# Altium footprint library sun_library.PcbLib: 412 footprints (part 20 of 26)
Each footprint in its own frame and in the unit in brackets; x right, y up, seen from the top. Pads: shape width x height; smd on the part's side, far side on the other; paste and mask are expansions set on the pad; w line width, h text height; cw(c..) or ccw(c..) is an arc to the next point about the centre after c.
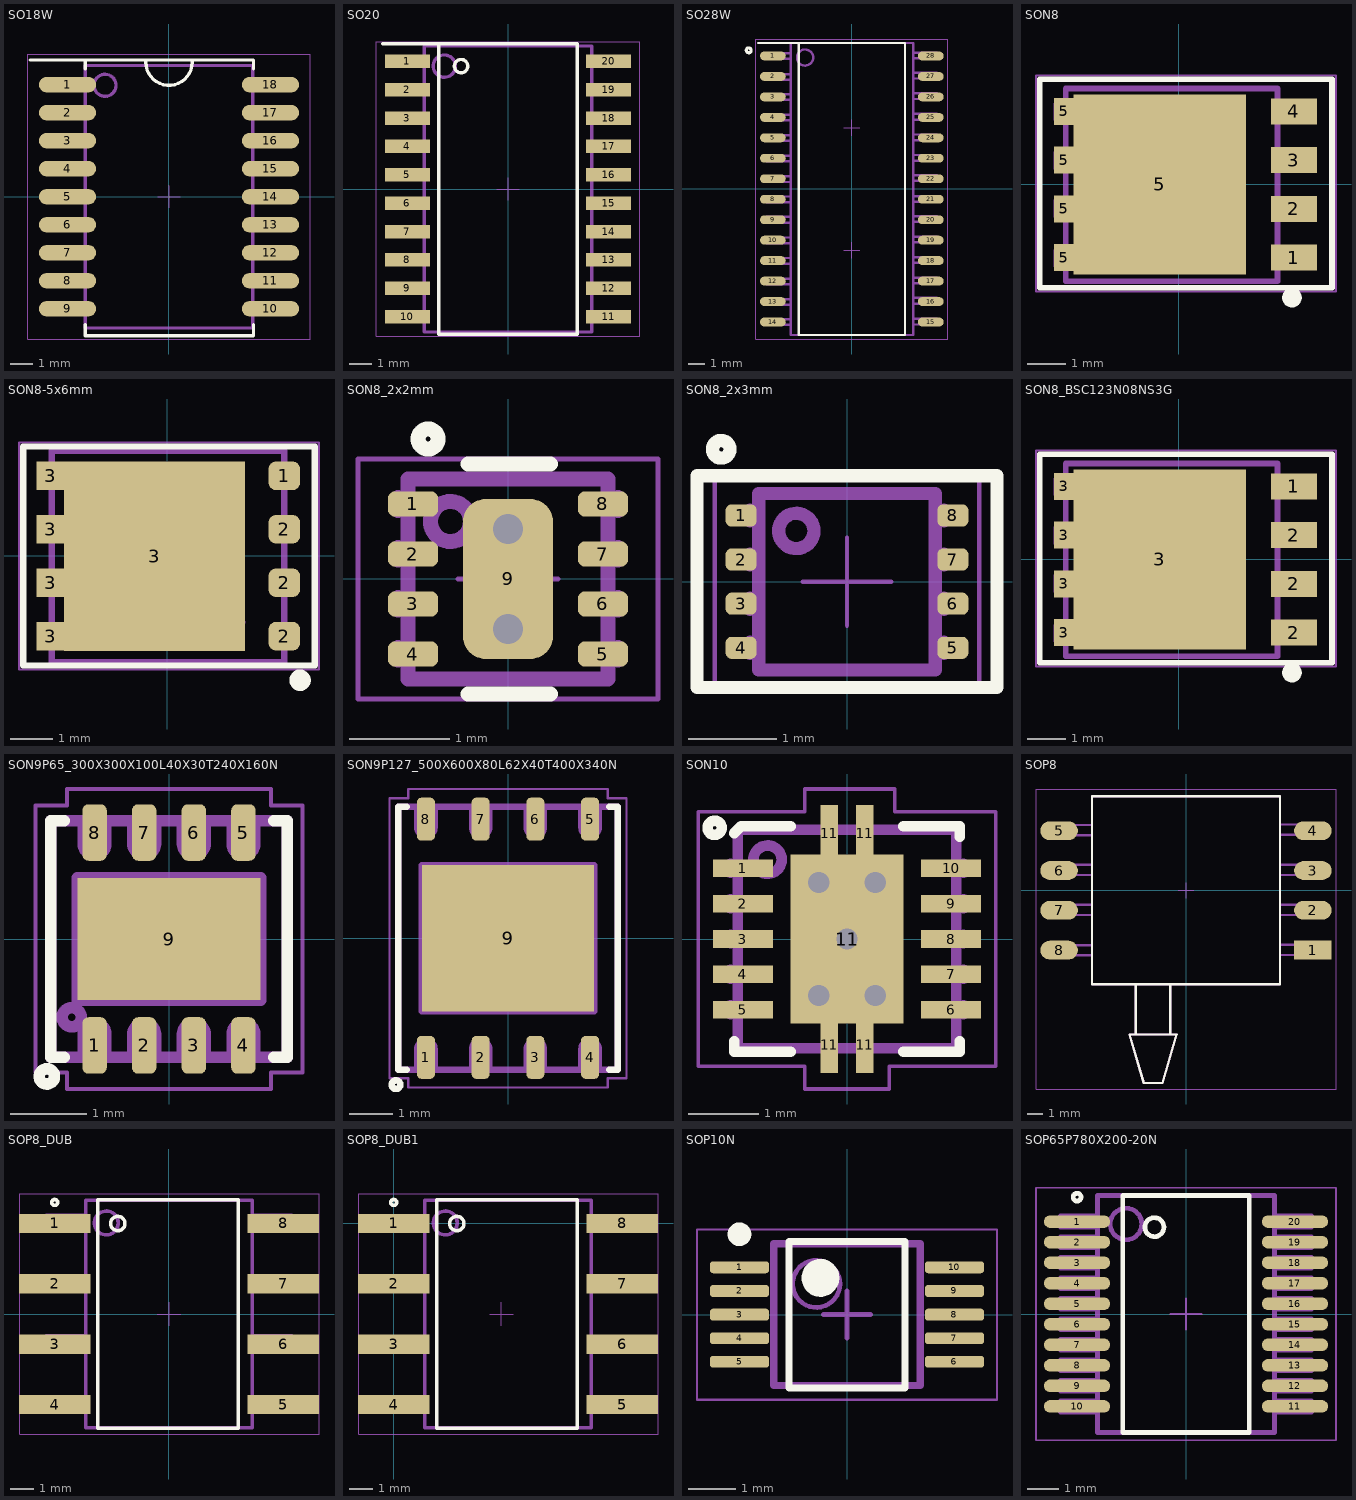
[diagram p19: the footprints below, top view; thin cyan lines are the x and y axes]

## SO18W [mm] "18-Pin Small Outline Integrated Circuit 1.27 mm Pitch, IPC Low Density"
height 2.65
pads (18):
  oval 2.6x0.7 smd: 1(-4.6,5.08) 2(-4.6,3.81) 3(-4.6,2.54) 4(-4.6,1.27) 5(-4.6,0) 6(-4.6,-1.27) 7(-4.6,-2.54) 8(-4.6,-3.81) 9(-4.6,-5.08) 10(4.6,-5.08) 11(4.6,-3.81) 12(4.6,-2.54) 13(4.6,-1.27) 14(4.6,0) 15(4.6,1.27) 16(4.6,2.54) 17(4.6,3.81) 18(4.6,5.08)
Top Overlay:
  lines w0.15: -6.3,6.2 -3.8,6.2 ; -3.8,-5.8 -3.8,-6.3 3.83,-6.3 3.83,-5.8 ; -3.8,5.8 -3.8,6.2 ; -1.05,6.1 ccw(c0,6.1) 1.05,6.1 ; 3.83,5.8 3.83,6.2 -3.8,6.2
TopAssy 13:
  circle w0.15: c-2.9,5.05 r0.5
  lines w0.15: -3.8,-5.25 -5.275,-5.25 -5.275,-4.9 -3.8,-4.9 ; -3.8,-3.975 -5.275,-3.975 -5.275,-3.625 -3.8,-3.625 ; -3.8,-2.725 -5.275,-2.725 -5.275,-2.375 -3.8,-2.375 ; -3.8,-1.45 -5.275,-1.45 -5.275,-1.1 -3.8,-1.1 ; -3.8,-0.175 -5.275,-0.175 -5.275,0.175 -3.8,0.175 ; -3.8,1.1 -5.275,1.1 -5.275,1.45 -3.8,1.45 ; -3.8,2.375 -5.275,2.375 -5.275,2.725 -3.8,2.725 ; -3.8,3.625 -5.275,3.625 -5.275,3.975 -3.8,3.975 ; -3.8,4.925 -5.275,4.925 -5.275,5.275 -3.8,5.275 ; 3.8,-5.25 5.275,-5.25 5.275,-4.9 3.8,-4.9 ; 3.8,-3.95 5.275,-3.95 5.275,-3.6 3.8,-3.6 ; 3.8,-2.7 5.275,-2.7 5.275,-2.35 3.8,-2.35 ; 3.8,-1.425 5.275,-1.425 5.275,-1.075 3.8,-1.075 ; 3.8,-0.15 5.275,-0.15 5.275,0.2 3.8,0.2 ; 3.8,1.125 5.275,1.125 5.275,1.475 3.8,1.475 ; 3.8,2.4 5.275,2.4 5.275,2.75 3.8,2.75 ; 3.8,3.65 5.275,3.65 5.275,4 3.8,4 ; 3.8,4.925 5.275,4.925 5.275,5.275 3.8,5.275 ; -3.8,-5.95 -3.8,5.95 3.8,5.95 3.8,-5.95 -3.8,-5.95
CourtTop 15:
  lines w0.05: -0.5,0 0.5,0 ; 0,-0.5 0,0.5 ; -6.4,-6.45 6.4,-6.45 6.4,6.45 -6.4,6.45 -6.4,-6.45
3D body "User Library-SOIC-18-300.STEP": height 2.57, standoff -0.03, extent -5.275,-5.875 5.325,5.875

## SO20 [mm]
height 1.1
pads (20):
  rect 2x0.6 smd: 1(-4.5,5.715) 2(-4.5,4.445) 3(-4.5,3.175) 4(-4.5,1.905) 5(-4.5,0.635) 6(-4.5,-0.635) 7(-4.5,-1.905) 8(-4.5,-3.175) 9(-4.5,-4.445) 10(-4.5,-5.715) 11(4.5,-5.715) 12(4.5,-4.445) 13(4.5,-3.175) 14(4.5,-1.905) 15(4.5,-0.635) 16(4.5,0.635) 17(4.5,1.905) 18(4.5,3.175) 19(4.5,4.445) 20(4.5,5.715)
Top Overlay:
  circle w0.15: c-2.1,5.5 r0.3
  lines w0.15: -5.6,6.5 -3.1,6.5 ; -3.1,6.5 3.1,6.5 3.1,-6.5 -3.1,-6.5 -3.1,6.5
TopAssy 13:
  circle w0.15: c-2.85,5.5 r0.5
  lines w0.15: -3.775,-3.375 -5.275,-3.375 -5.275,-3.025 -3.775,-3.025 ; -3.775,-2.1 -5.275,-2.1 -5.275,-1.75 -3.775,-1.75 ; -3.775,-0.825 -5.275,-0.825 -5.275,-0.475 -3.775,-0.475 ; -3.775,0.45 -5.3,0.45 -5.3,0.8 -3.775,0.8 ; -3.775,1.725 -5.3,1.725 -5.3,2.075 -3.775,2.075 ; -3.775,3 -5.3,3 -5.3,3.35 -3.775,3.35 ; -3.775,4.25 -5.3,4.25 -5.3,4.6 -3.775,4.6 ; -3.775,5.55 -5.3,5.55 -5.3,5.9 -3.775,5.9 ; -3.75,-5.9 -5.25,-5.9 -5.25,-5.55 -3.75,-5.55 ; -3.75,-4.625 -5.25,-4.625 -5.25,-4.275 -3.75,-4.275 ; 3.725,4.275 5.225,4.275 5.225,4.625 3.725,4.625 ; 3.725,5.55 5.225,5.55 5.225,5.9 3.725,5.9 ; 3.75,-5.9 5.275,-5.9 5.275,-5.55 3.75,-5.55 ; 3.75,-4.6 5.275,-4.6 5.275,-4.25 3.75,-4.25 ; 3.75,-3.35 5.275,-3.35 5.275,-3 3.75,-3 ; 3.75,-2.075 5.275,-2.075 5.275,-1.725 3.75,-1.725 ; 3.75,-0.8 5.275,-0.8 5.275,-0.45 3.75,-0.45 ; 3.75,0.475 5.25,0.475 5.25,0.825 3.75,0.825 ; 3.75,1.75 5.25,1.75 5.25,2.1 3.75,2.1 ; 3.75,3.025 5.25,3.025 5.25,3.375 3.75,3.375 ; -3.75,-6.4 3.75,-6.4 3.75,6.4 -3.75,6.4 -3.75,-6.4
CourtTop 15:
  lines w0.05: -0.5,0 0.5,0 ; 0,-0.5 0,0.5 ; -5.9,-6.6 5.9,-6.6 5.9,6.6 -5.9,6.6 -5.9,-6.6
3D body "User Library-SOIC20_JEDEC_MS-013AC.step": height 2.66, standoff 0, extent -5.315,-6.5 5.315,6.5

## SO28W [mm] "SOIC, 28-Leads, Body 18x7.5mm, Pitch 1.27mm, IPC Medium Density"
height 2.67
pads (28):
  oval 1.6x0.55 smd: 1(-4.9,8.258) 2(-4.9,6.983) 3(-4.9,5.713) 4(-4.9,4.443) 5(-4.9,3.173) 6(-4.9,1.903) 7(-4.9,0.633) 8(-4.9,-0.637) 9(-4.9,-1.907) 10(-4.9,-3.177) 11(-4.9,-4.447) 12(-4.9,-5.717) 13(-4.9,-6.987) 14(-4.9,-8.257) 15(4.9,-8.257) 16(4.9,-6.987) 17(4.9,-5.717) 18(4.9,-4.447) 19(4.9,-3.177) 20(4.9,-1.907) 21(4.9,-0.637) 22(4.9,0.633) 23(4.9,1.903) 24(4.9,3.173) 25(4.9,4.443) 26(4.9,5.713) 27(4.9,6.983) 28(4.9,8.253)
Top Overlay:
  circle w0.2: c-6.4,8.608 r0.15
  lines w0.15: -5.8,9.057 -3.3,9.057 ; -3.3,9.058 3.3,9.058 3.3,-9.062 -3.3,-9.062 -3.3,9.058
TopAssy 13:
  circle w0.15: c-2.9,8.157 r0.5
  lines w0.15: -3.8,-8.437 -5.275,-8.437 -5.275,-8.087 -3.8,-8.087 ; -3.8,-7.187 -5.275,-7.187 -5.275,-6.837 -3.8,-6.837 ; -3.8,-5.912 -5.275,-5.912 -5.275,-5.562 -3.8,-5.562 ; -3.8,-4.637 -5.275,-4.637 -5.275,-4.287 -3.8,-4.287 ; -3.8,-3.362 -5.275,-3.362 -5.275,-3.012 -3.8,-3.012 ; -3.8,-2.087 -5.275,-2.087 -5.275,-1.737 -3.8,-1.737 ; -3.8,-0.817 -5.275,-0.817 -5.275,-0.467 -3.8,-0.467 ; -3.8,0.433 -5.275,0.433 -5.275,0.783 -3.8,0.783 ; -3.8,1.708 -5.275,1.708 -5.275,2.058 -3.8,2.058 ; -3.8,2.983 -5.275,2.983 -5.275,3.333 -3.8,3.333 ; -3.8,4.258 -5.275,4.258 -5.275,4.608 -3.8,4.608 ; -3.8,5.533 -5.275,5.533 -5.275,5.883 -3.8,5.883 ; -3.8,6.783 -5.275,6.783 -5.275,7.133 -3.8,7.133 ; -3.8,8.083 -5.275,8.083 -5.275,8.433 -3.8,8.433 ; 3.8,-8.413 5.275,-8.413 5.275,-8.063 3.8,-8.063 ; 3.8,-7.113 5.275,-7.113 5.275,-6.763 3.8,-6.763 ; 3.8,-5.863 5.275,-5.863 5.275,-5.513 3.8,-5.513 ; 3.8,-4.588 5.275,-4.588 5.275,-4.238 3.8,-4.238 ; 3.8,-3.313 5.275,-3.313 5.275,-2.963 3.8,-2.963 ; 3.8,-2.038 5.275,-2.038 5.275,-1.688 3.8,-1.688 ; 3.8,-0.793 5.275,-0.793 5.275,-0.443 3.8,-0.443 ; 3.8,0.507 5.275,0.507 5.275,0.857 3.8,0.857 ; 3.8,1.757 5.275,1.757 5.275,2.107 3.8,2.107 ; 3.8,3.032 5.275,3.032 5.275,3.382 3.8,3.382 ; 3.8,4.307 5.275,4.307 5.275,4.657 3.8,4.657 ; 3.8,5.582 5.275,5.582 5.275,5.932 3.8,5.932 ; 3.8,6.857 5.275,6.857 5.275,7.207 3.8,7.207 ; 3.8,8.107 5.275,8.107 5.275,8.457 3.8,8.457 ; -3.8,-9.062 -3.8,9.058 3.8,9.058 3.8,-9.062 -3.8,-9.062
CourtTop 15:
  lines w0.05: -0.5,-3.812 0.5,-3.812 ; -0.5,3.808 0.5,3.808 ; 0,-4.312 0,-3.313 ; 0,3.308 0,4.307 ; -5.95,-9.312 -5.95,9.307 5.95,9.307 5.95,-9.312 -5.95,-9.312
3D body "User Library-SO-28W.STEP": height 2.49, standoff 0.01, extent -5.155,-8.965 5.155,8.965

## SON8 [mm] "TDSON8"
pads (9):
  rect 1.2x0.675 smd: 1(3,-1.905) 2(3,-0.635) 3(3,0.635) 4(3,1.905)
  rect 0.5x0.7 smd: 5(-3,-1.905) 5(-3,-0.635) 5(-3,0.635) 5(-3,1.905)
  rect 4.5x4.7 smd paste-10: 5(-0.5,0)
Top Overlay:
  circle w0.25: c2.95,-2.95 r0.13
  lines w0.15: -3.625,-2.692 -3.625,2.743 3.996,2.743 3.996,-2.692 -3.625,-2.692
Top Paste:
  rectangle: 0.007,-1.891 1.38,-0.321
  rectangle: -2.083,-1.891 -0.703,-0.321
  rectangle: 0.007,0.299 1.405,1.869
  rectangle: -2.083,0.299 -0.703,1.869
TopAssy 13:
  circle w0.15: c1.375,-1.575 r0.2
  lines w0.15: -2.95,-2.125 -3.2,-2.125 -3.2,-1.725 -2.95,-1.725 ; -2.95,-0.825 -3.2,-0.825 -3.2,-0.425 -2.95,-0.425 ; -2.95,0.425 -3.2,0.425 -3.2,0.825 -2.95,0.825 ; -2.95,1.7 -3.2,1.7 -3.2,2.1 -2.95,2.1 ; 2.575,-2.1 2.825,-2.1 2.825,-1.7 2.575,-1.7 ; 2.575,-0.825 2.825,-0.825 2.825,-0.425 2.575,-0.425 ; 2.575,0.425 2.825,0.425 2.825,0.825 2.575,0.825 ; 2.575,1.725 2.825,1.725 2.825,2.125 2.575,2.125 ; -2.95,-2.525 2.575,-2.525 2.575,2.5 -2.95,2.5 -2.95,-2.525
CourtTop 15:
  lines w0.05: -0.7,0 0.3,0 ; -0.2,-0.5 -0.2,0.5 ; -3.725,-2.794 -3.725,2.845 4.097,2.845 4.097,-2.794 -3.725,-2.794
3D body "User Library-TDSON-8-1.step": height 1.05, standoff 0.05, extent -2.923,-2.675 3.227,2.675

## SON8-5x6mm [mm] "SON8-5x6mm, TDFN8"
pads (9):
  rrect50% 0.75x0.675 smd paste-10: 1(2.776,1.905) 2(2.776,-1.905) 2(2.776,-0.635) 2(2.776,0.635)
  rect 0.655x0.675 smd paste-10: 3(-2.776,-1.905) 3(-2.776,-0.635) 3(-2.776,0.635) 3(-2.776,1.905)
  rect 4.3x4.5 smd paste-10: 3(-0.304,-0.005)
Top Overlay:
  circle w0.25: c3.15,-2.95 r0.13
  lines w0.15: -3.425,-2.6 3.5,-2.6 3.5,2.6 -3.425,2.6 -3.425,-2.6
Top Paste:
  rectangle: -1.883,0.299 -0.298,1.869
  rectangle: 0.207,0.299 1.442,1.869
  rectangle: -1.883,-1.891 -0.298,-0.321
  rectangle: 0.207,-1.891 1.442,-0.321
  rectangle: -3.026,1.655 -2.526,2.155
  rectangle: -3.026,0.385 -2.526,0.885
  rectangle: -3.026,-0.885 -2.526,-0.385
  rectangle: -3.026,-2.155 -2.526,-1.655
  rectangle: 2.526,-2.155 3.026,-1.655
  rectangle: 2.526,-0.885 3.026,-0.385
  rectangle: 2.526,0.385 3.026,0.885
  rectangle: 2.526,1.655 3.026,2.155
TopAssy 13:
  circle w0.15: c1.575,-1.575 r0.2
  lines w0.15: -2.75,-2.125 -3,-2.125 -3,-1.725 -2.75,-1.725 ; -2.75,-0.825 -3,-0.825 -3,-0.425 -2.75,-0.425 ; -2.75,0.425 -3,0.425 -3,0.825 -2.75,0.825 ; -2.75,1.7 -3,1.7 -3,2.1 -2.75,2.1 ; 2.775,-2.1 3.025,-2.1 3.025,-1.7 2.775,-1.7 ; 2.775,-0.825 3.025,-0.825 3.025,-0.425 2.775,-0.425 ; 2.775,0.425 3.025,0.425 3.025,0.825 2.775,0.825 ; 2.775,1.725 3.025,1.725 3.025,2.125 2.775,2.125 ; -2.75,-2.525 -2.75,2.5 2.775,2.5 2.775,-2.525 -2.75,-2.525
CourtTop 15:
  lines w0.05: -0.5,0 0.5,0 ; 0,-0.5 0,0.5 ; -3.525,-2.7 3.6,-2.7 3.6,2.7 -3.525,2.7 -3.525,-2.7
3D body "User Library-SON8-5x6mm.step": height 1.05, standoff 0, extent -2.975,-2.5 3.025,2.5

## SON8_2x2mm [mm] "SON, 8-Leads, Body 3,00x3,00mm, Pitch 0,50mm, Thermal Pad 2,40x1,65mm, IPC Medium Density"
height 1
pads (9):
  rrect50% 0.5x0.25 smd mask+0.05: 1(-0.95,0.75) 2(-0.95,0.25) 3(-0.95,-0.25) 4(-0.95,-0.75) 5(0.95,-0.75) 6(0.95,-0.25) 7(0.95,0.25) 8(0.95,0.75)
  rrect50% 0.9x1.6 smd paste-1 mask+0.05: 9(0,0)
via 0,0.5 diameter 0.6 hole 0.3
via 0,-0.5 diameter 0.6 hole 0.3
Top Overlay:
  circle w0.15: c-0.8,1.4 r0.1
  lines w0.15: -0.4,-1.15 0.425,-1.15 ; -0.4,1.15 0.425,1.15
Top Paste:
  region: -0.456,0.33 -0.456,0.29 -0.425,0.217 -0.369,0.16 -0.296,0.13 -0.256,0.13 0.233,0.13 0.275,0.13 0.352,0.162 0.412,0.222 0.444,0.3 0.444,0.342 0.444,0.58 0.444,0.62 0.414,0.693 0.357,0.75 0.284,0.78 0.244,0.78 -0.244,0.78 -0.286,0.78 -0.364,0.748 -0.424,0.688 -0.456,0.61 -0.456,0.568
  region: -0.446,-0.58 -0.446,-0.62 -0.415,-0.693 -0.359,-0.75 -0.286,-0.78 -0.246,-0.78 0.243,-0.78 0.285,-0.78 0.362,-0.748 0.422,-0.688 0.454,-0.61 0.454,-0.568 0.454,-0.33 0.454,-0.29 0.424,-0.217 0.367,-0.16 0.294,-0.13 0.254,-0.13 -0.234,-0.13 -0.276,-0.13 -0.354,-0.162 -0.414,-0.222 -0.446,-0.3 -0.446,-0.342
TopAssy 13:
  circle w0.15: c-0.575,0.575 r0.2
  lines w0.15: -1.1,-0.812 -1.1,-0.687 ; -1.1,-0.312 -1.1,-0.187 ; -1.1,0.188 -1.1,0.313 ; -1.1,0.687 -1.1,0.813 ; 1.1,-0.812 1.1,-0.687 ; 1.1,-0.312 1.1,-0.187 ; 1.1,0.188 1.1,0.313 ; 1.1,0.687 1.1,0.813 ; -1,-1 1,-1 1,1 -1,1 -1,-1
CourtTop 15:
  lines w0.05: -0.5,0 0.5,0 ; 0,-0.5 0,0.5 ; -1.5,-1.2 1.5,-1.2 1.5,1.2 -1.5,1.2 -1.5,-1.2
3D body "User Library-SON8-2x2mm-1.step": height 0.79, standoff -0.01, extent -1,-1 1,1

## SON8_2x3mm [mm] "SON, 8-Leads, Body 2,00x3,00mm, Pitch 0,50mm, IPC Medium Density"
height 1
pads (8):
  rrect50% 0.35x0.25 smd mask+0.05: 1(-1.2,0.75) 2(-1.2,0.25) 3(-1.2,-0.25) 4(-1.2,-0.75) 5(1.2,-0.75) 6(1.2,-0.25) 7(1.2,0.25) 8(1.2,0.75)
Top Overlay:
  circle w0.15: c-1.425,1.5 r0.1
  lines w0.15: -1.7,-1.2 1.7,-1.2 1.7,1.2 -1.7,1.2 -1.7,-1.2
TopAssy 13:
  circle w0.15: c-0.575,0.575 r0.2
  lines w0.15: -1.1,-0.812 -1.1,-0.687 ; -1.1,-0.312 -1.1,-0.187 ; -1.1,0.188 -1.1,0.313 ; -1.1,0.687 -1.1,0.813 ; 1.1,-0.812 1.1,-0.687 ; 1.1,-0.312 1.1,-0.187 ; 1.1,0.188 1.1,0.313 ; 1.1,0.687 1.1,0.813 ; -1,-1 -1,1 1,1 1,-1 -1,-1
CourtTop 15:
  lines w0.05: -0.5,0 0.5,0 ; 0,-0.5 0,0.5 ; -1.5,-1.2 -1.5,1.2 1.5,1.2 1.5,-1.2 -1.5,-1.2
3D body "PSON9P50_200X300X60L30X25T160X20.STEP": height 0.6, standoff 0, extent -1.5,-1 1.5,1

## SON8_BSC123N08NS3G [mm] "TDSON8"
pads (9):
  rect 1.2x0.675 smd: 1(3,1.905) 2(3,-1.905) 2(3,-0.635) 2(3,0.635)
  rect 0.5x0.7 smd: 3(-3,-1.905) 3(-3,-0.635) 3(-3,0.635) 3(-3,1.905)
  rect 4.5x4.7 smd paste-10: 3(-0.5,0)
Top Overlay:
  circle w0.25: c2.95,-2.95 r0.13
  lines w0.15: -3.625,-2.692 3.996,-2.692 3.996,2.743 -3.625,2.743 -3.625,-2.692
Top Paste:
  rectangle: -2.083,0.299 -0.703,1.869
  rectangle: 0.007,0.299 1.405,1.869
  rectangle: -2.083,-1.891 -0.703,-0.321
  rectangle: 0.007,-1.891 1.38,-0.321
TopAssy 13:
  circle w0.15: c1.375,-1.575 r0.2
  lines w0.15: -2.95,-2.125 -3.2,-2.125 -3.2,-1.725 -2.95,-1.725 ; -2.95,-0.825 -3.2,-0.825 -3.2,-0.425 -2.95,-0.425 ; -2.95,0.425 -3.2,0.425 -3.2,0.825 -2.95,0.825 ; -2.95,1.7 -3.2,1.7 -3.2,2.1 -2.95,2.1 ; 2.575,-2.1 2.825,-2.1 2.825,-1.7 2.575,-1.7 ; 2.575,-0.825 2.825,-0.825 2.825,-0.425 2.575,-0.425 ; 2.575,0.425 2.825,0.425 2.825,0.825 2.575,0.825 ; 2.575,1.725 2.825,1.725 2.825,2.125 2.575,2.125 ; -2.95,-2.525 -2.95,2.5 2.575,2.5 2.575,-2.525 -2.95,-2.525
CourtTop 15:
  lines w0.05: -0.7,0 0.3,0 ; -0.2,-0.5 -0.2,0.5 ; -3.725,-2.794 4.097,-2.794 4.097,2.845 -3.725,2.845 -3.725,-2.794
3D body "User Library-TDSON-8-1.step": height 1.05, standoff 0.05, extent -2.923,-2.675 3.227,2.675

## SON9P65_300X300X100L40X30T240X160N [mm] "Small Outline No-Lead (SON with Tab), 0.65 mm pitch; 8 pin, 3.00 mm L X 3.00 mm W X 1.00 mm H body"
height 1
pads (9):
  rrect50% 0.32x0.74 smd: 1(-0.975,-1.395) 2(-0.325,-1.395) 3(0.325,-1.395) 4(0.975,-1.395) 5(0.975,1.395) 6(0.325,1.395) 7(-0.325,1.395) 8(-0.975,1.395)
  rect 2.4x1.6 smd paste-2.4 mask+0: 9(0,0)
Top Overlay:
  circle w0.15: c-1.6,-1.8 r0.1
  lines w0.15: -1.375,-1.55 -1.55,-1.55 -1.55,1.55 -1.375,1.55 ; 1.375,-1.55 1.55,-1.55 1.55,1.55 1.375,1.55
Top Paste:
  region: 1.015,-0.615 0.095,-0.615 0.095,-0.095 1.015,-0.095
  region: 1.015,0.095 0.095,0.095 0.095,0.615 1.015,0.615
  region: -0.095,-0.615 -1.015,-0.615 -1.015,-0.095 -0.095,-0.095
  region: -0.095,0.095 -1.015,0.095 -1.015,0.615 -0.095,0.615
TopAssy 13:
  circle w0.15: c-1.275,-1.025 r0.125
  lines w0.15: -1.55,-1.55 -1.55,1.55 1.55,1.55 1.55,-1.55 -1.55,-1.55 ; -1.2,-0.8 1.2,-0.8 1.2,0.8 -1.2,0.8 -1.2,-0.8 ; -1.125,-1.5 -1.125,-1.25 cw(c-0.975,-1.25) -0.825,-1.25 -0.825,-1.5 -1.125,-1.5 ; -1.125,1.25 ccw(c-0.975,1.25) -0.825,1.25 -0.825,1.5 -1.125,1.5 -1.125,1.25 ; -0.475,-1.5 -0.475,-1.25 cw(c-0.325,-1.25) -0.175,-1.25 -0.175,-1.5 -0.475,-1.5 ; -0.475,1.25 ccw(c-0.325,1.25) -0.175,1.25 -0.175,1.5 -0.475,1.5 -0.475,1.25 ; 0.175,-1.5 0.175,-1.25 cw(c0.325,-1.25) 0.475,-1.25 0.475,-1.5 0.175,-1.5 ; 0.175,1.25 ccw(c0.325,1.25) 0.475,1.25 0.475,1.5 0.175,1.5 0.175,1.25 ; 0.825,-1.5 0.825,-1.25 cw(c0.975,-1.25) 1.125,-1.25 1.125,-1.5 0.825,-1.5 ; 0.825,1.25 ccw(c0.975,1.25) 1.125,1.25 1.125,1.5 0.825,1.5 0.825,1.25
CourtTop 15:
  circle w0.05: c0,0 r0.25
  lines w0.05: -0.35,0 0.35,0 ; 0,-0.35 0,0.35 ; -1.75,-1.75 -1.75,1.75 -1.335,1.75 -1.335,1.965 1.335,1.965 1.335,1.75 1.75,1.75 1.75,-1.75 1.335,-1.75 1.335,-1.965 -1.335,-1.965 -1.335,-1.75 -1.75,-1.75
3D body "SON9P65_300X300X100L40X30T240X160.STEP": height 1, standoff 0, extent -1.5,-1.55 1.5,1.55

## SON9P127_500X600X80L62X40T400X340N [mm] "Small Outline No-Lead (SON with Tab), 1.27 mm pitch; 8 pin, 5.00 mm L X 6.00 mm W X 0.80 mm H body"
height 0.8
pads (9):
  rrect52% 0.42x1 smd: 1(-1.905,-2.765) 2(-0.635,-2.765) 3(0.635,-2.765) 4(1.905,-2.765) 5(1.905,2.765) 6(0.635,2.765) 7(-0.635,2.765) 8(-1.905,2.765)
  rect 4x3.4 smd paste-4 mask+0: 9(0,0)
Top Overlay:
  circle w0.15: c-2.6,-3.4 r0.1
  lines w0.15: -2.35,-3.05 -2.55,-3.05 -2.55,3.05 -2.35,3.05 ; 2.35,-3.05 2.55,-3.05 2.55,3.05 2.35,3.05
Top Paste:
  region: 1.64,-1.34 0.18,-1.34 0.18,-0.18 1.64,-0.18
  region: 1.64,0.18 0.18,0.18 0.18,1.34 1.64,1.34
  region: -0.18,-1.34 -1.64,-1.34 -1.64,-0.18 -0.18,-0.18
  region: -0.18,0.18 -1.64,0.18 -1.64,1.34 -0.18,1.34
TopAssy 13:
  lines w0.15: -2.55,-3.05 -2.55,3.05 2.55,3.05 2.55,-3.05 -2.55,-3.05 ; -2.105,-3 -2.105,-2.575 cw(c-1.905,-2.575) -1.705,-2.575 -1.705,-3 -2.105,-3 ; -2.105,2.575 ccw(c-1.905,2.575) -1.705,2.575 -1.705,3 -2.105,3 -2.105,2.575 ; -2,-1.7 2,-1.7 2,1.7 -2,1.7 -2,-1.7 ; -0.835,-3 -0.835,-2.575 cw(c-0.635,-2.575) -0.435,-2.575 -0.435,-3 -0.835,-3 ; -0.835,2.575 ccw(c-0.635,2.575) -0.435,2.575 -0.435,3 -0.835,3 -0.835,2.575 ; 0.435,-3 0.435,-2.575 cw(c0.635,-2.575) 0.835,-2.575 0.835,-3 0.435,-3 ; 0.435,2.575 ccw(c0.635,2.575) 0.835,2.575 0.835,3 0.435,3 0.435,2.575 ; 1.705,-3 1.705,-2.575 cw(c1.905,-2.575) 2.105,-2.575 2.105,-3 1.705,-3 ; 1.705,2.575 ccw(c1.905,2.575) 2.105,2.575 2.105,3 1.705,3 1.705,2.575
CourtTop 15:
  circle w0.05: c0,0 r0.25
  lines w0.05: -0.35,0 0.35,0 ; 0,-0.35 0,0.35 ; -2.75,-3.25 -2.75,3.25 -2.315,3.25 -2.315,3.465 2.315,3.465 2.315,3.25 2.75,3.25 2.75,-3.25 2.315,-3.25 2.315,-3.465 -2.315,-3.465 -2.315,-3.25 -2.75,-3.25
3D body "SON9P127_500X600X80L62X40T400X340.STEP": height 0.8, standoff 0, extent -2.5,-3.05 2.5,3.05

## SON10 [mm] "SON, 10-Leads, Body 3,00x3,00mm, Pitch 0,50mm, Thermal Pad 2,40x1,65mm, IPC Medium Density"
height 1
pads (15):
  rect 0.85x0.25 smd paste-0.5 mask+0.075: 1(-1.475,1) 2(-1.475,0.5) 3(-1.475,0) 4(-1.475,-0.5) 5(-1.475,-1) 6(1.475,-1) 7(1.475,-0.5) 8(1.475,0) 9(1.475,0.5) 10(1.475,1)
  rect 0.25x0.8 smd paste-0.5 mask+0.075: 11(-0.25,-1.5) 11(-0.25,1.5) 11(0.25,-1.5) 11(0.25,1.5)
  rect 1.6x2.4 smd paste-1 mask+0.075: 11(0,0)
via 0.4,-0.8 diameter 0.6 hole 0.3
via -0.4,-0.8 diameter 0.6 hole 0.3
via 0.4,0.8 diameter 0.6 hole 0.3
via -0.4,0.8 diameter 0.6 hole 0.3
via 0,0 diameter 0.6 hole 0.3
Top Overlay:
  circle w0.15: c-1.875,1.575 r0.1
  lines w0.15: -1.6,-1.45 -1.6,-1.6 -0.8,-1.6 ; -1.6,1.5 -1.5,1.6 -0.8,1.6 ; 0.8,-1.6 1.6,-1.6 1.6,-1.45 ; 0.8,1.6 1.6,1.6 1.6,1.45
Top Paste:
  drawing of 28 lines, arcs and shapes, not listed
TopAssy 13:
  circle w0.15: c-1.125,1.125 r0.2
  lines w0.15: -1.65,-1.063 -1.65,-0.937 ; -1.65,-0.562 -1.65,-0.437 ; -1.65,-0.062 -1.65,0.063 ; -1.65,0.437 -1.65,0.563 ; -1.65,0.937 -1.65,1.062 ; 1.65,-1.063 1.65,-0.937 ; 1.65,-0.562 1.65,-0.437 ; 1.65,-0.062 1.65,0.063 ; 1.65,0.437 1.65,0.563 ; 1.65,0.937 1.65,1.062 ; -1.55,-1.55 -1.55,1.55 1.55,1.55 1.55,-1.55 -1.55,-1.55
CourtTop 15:
  lines w0.05: -0.5,0 0.5,0 ; 0,-0.5 0,0.5 ; -2.105,-1.8 -2.105,1.8 -0.6,1.8 -0.6,2.125 0.675,2.125 0.675,1.8 2.105,1.8 2.105,-1.8 0.6,-1.8 0.6,-2.125 -0.6,-2.125 -0.6,-1.8 -2.105,-1.8
3D body "User Library-SON10-3x3mm.step": height 0.89, standoff -0.01, extent -1.5,-1.5 1.5,1.5

## SOP8 [mm] "Корпус SOP8"
height 7.5
pads (8):
  rect 2.4x1.2 smd: 1(8.1,-3.81)
  oval 2.4x1.2 smd: 2(8.1,-1.27) 3(8.1,1.27) 4(8.1,3.81) 5(-8.1,3.81) 6(-8.1,1.27) 7(-8.1,-1.27) 8(-8.1,-3.81)
Top Overlay:
  lines w0.15: -3.2,-9.194 -3.2,-5.994 ; -1,-9.194 -1,-5.994 ; -6,-5.994 -6,6.006 6,6.006 6,-5.994 -6,-5.994 ; -3.6,-9.194 -2.7,-12.294 -1.5,-12.294 -0.6,-9.194 -3.6,-9.194
TopAssy 13:
  lines w0.15: -6,-4.144 -8.375,-4.144 -8.375,-3.494 -6,-3.494 ; -6,-1.569 -8.375,-1.569 -8.375,-0.919 -6,-0.919 ; -6,0.981 -8.375,0.981 -8.375,1.631 -6,1.631 ; -6,3.531 -8.375,3.531 -8.375,4.181 -6,4.181 ; -3.2,-9.194 -3.2,-5.994 ; -1,-9.194 -1,-5.994 ; 6,-4.119 8.375,-4.119 8.375,-3.469 6,-3.469 ; 6,-1.569 8.375,-1.569 8.375,-0.919 6,-0.919 ; 6,0.981 8.375,0.981 8.375,1.631 6,1.631 ; 6,3.556 8.375,3.556 8.375,4.206 6,4.206 ; -6,-5.994 6,-5.994 6,6.006 -6,6.006 -6,-5.994 ; -3.6,-9.194 -0.6,-9.194 -1.5,-12.294 -2.7,-12.294 -3.6,-9.194
CourtTop 15:
  lines w0.05: -0.5,0 0.5,0 ; 0,-0.5 0,0.5 ; -9.575,-12.675 -9.575,6.475 9.575,6.475 9.575,-12.675 -9.575,-12.675

## SOP8_DUB [mm]
pads (8):
  rect 3x0.8 smd: 1(-4.8,3.81) 2(-4.8,1.27) 3(-4.8,-1.27) 4(-4.8,-3.81) 5(4.8,-3.81) 6(4.8,-1.27) 7(4.8,1.27) 8(4.8,3.81)
Top Overlay:
  circle w0.15: c-2.15,3.8 r0.3
  circle w0.15: c-4.8,4.685 r0.125
  lines w0.15: -3,-4.8 2.9,-4.8 2.9,4.8 -3,4.8 -3,-4.8
TopAssy 13:
  circle w0.15: c-2.635,3.825 r0.5
  lines w0.15: -3.5,-4.125 -5.15,-4.125 -5.15,-3.475 -3.5,-3.475 ; -3.5,-1.575 -5.15,-1.575 -5.15,-0.925 -3.5,-0.925 ; -3.5,0.95 -5.15,0.95 -5.15,1.6 -3.5,1.6 ; -3.5,3.5 -5.15,3.5 -5.15,4.15 -3.5,4.15 ; 3.5,-4.125 5.15,-4.125 5.15,-3.475 3.5,-3.475 ; 3.5,-1.575 5.15,-1.575 5.15,-0.925 3.5,-0.925 ; 3.5,0.95 5.15,0.95 5.15,1.6 3.5,1.6 ; 3.5,3.5 5.15,3.5 5.15,4.15 3.5,4.15 ; -3.5,-4.775 3.5,-4.775 3.5,4.775 -3.5,4.775 -3.5,-4.775
CourtTop 15:
  lines w0.05: -0.5,0 0.5,0 ; 0,-0.5 0,0.5 ; -6.275,-5.05 6.3,-5.05 6.3,5.05 -6.275,5.05 -6.275,-5.05
3D body "User Library-IPC SOP8.step": height 6.5, standoff 0, extent -5.203,-4.945 5.203,4.965

## SOP8_DUB1 [mm]
pads (8):
  rect 3x0.8 smd: 1(0,0) 2(0,-2.54) 3(0,-5.08) 4(0,-7.62) 5(9.6,-7.62) 6(9.6,-5.08) 7(9.6,-2.54) 8(9.6,0)
Top Overlay:
  circle w0.15: c0,0.875 r0.125
  circle w0.15: c2.65,-0.01 r0.3
  lines w0.15: 1.8,-8.61 1.8,0.99 7.7,0.99 7.7,-8.61 1.8,-8.61
TopAssy 13:
  circle w0.15: c2.165,0.015 r0.5
  lines w0.15: 1.3,-8.585 1.3,0.965 8.3,0.965 8.3,-8.585 1.3,-8.585
CourtTop 15:
  lines w0.05: 4.025,-3.81 5.025,-3.81 ; 4.525,-4.31 4.525,-3.31 ; -1.475,-8.86 -1.475,1.24 11.1,1.24 11.1,-8.86 -1.475,-8.86
3D body "User Library-DUB8-2.STEP": height 0, standoff 0, extent -2.675,-2.51 -2.675,-2.51
3D body "User Library-IPC SOP8.step": height 6.5, standoff 0, extent -0.403,-8.755 10.003,1.155

## SOP10N [mm] "TSSOP, 10-Leads, Body 3,00x3,00mm, Pitch 0,50mm, IPC Medium Density"
height 1.1
pads (10):
  rrect50% 1.25x0.25 smd mask+0.05: 1(-2.275,1) 2(-2.275,0.5) 3(-2.275,0) 4(-2.275,-0.5) 5(-2.275,-1) 6(2.275,-1) 7(2.275,-0.5) 8(2.275,0) 9(2.275,0.5) 10(2.275,1)
Top Overlay:
  circle w0.25: c-2.275,1.7 r0.125
  circle w0.4: c-0.563,0.777 r0.2
  lines w0.15: -1.225,-1.55 -1.225,1.55 1.225,1.55 1.225,-1.55 -1.225,-1.55
TopAssy 13:
  circle w0.1: c-0.65,0.65 r0.5
  lines w0.15: -1.55,-1.5 1.55,-1.5 1.55,1.5 -1.55,1.5 -1.55,-1.5
CourtTop 15:
  lines w0.05: -3.175,-1.8 -3.175,1.8 3.175,1.8 3.175,-1.8 -3.175,-1.8
  lines w0.1: -0.5,0 0.5,0 ; 0,-0.5 0,0.5
3D body "MSOP-10-1.step": height 1.05, standoff 0, extent -2.514,-1.5 2.514,1.5

## SOP65P780X200-20N [mm] "SOP, 20-Leads, Body 7,20x5,30mm, Pitch 0,65mm, IPC Medium Density"
height 2
pads (20):
  oval 2.1x0.4 smd mask+0.075: 1(-3.45,2.925) 2(-3.45,2.275) 3(-3.45,1.625) 4(-3.45,0.975) 5(-3.45,0.325) 6(-3.45,-0.325) 7(-3.45,-0.975) 8(-3.45,-1.625) 9(-3.45,-2.275) 10(-3.45,-2.925) 11(3.45,-2.925) 12(3.45,-2.275) 13(3.45,-1.625) 14(3.45,-0.975) 15(3.45,-0.325) 16(3.45,0.325) 17(3.45,0.975) 18(3.45,1.625) 19(3.45,2.275) 20(3.45,2.925)
Top Overlay:
  circle w0.15: c-1,2.75 r0.3
  circle w0.15: c-3.45,3.7 r0.125
  lines w0.15: -2,-3.75 2,-3.75 2,3.75 -2,3.75 -2,-3.75
TopAssy 13:
  circle w0.15: c-1.9,2.85 r0.5
  lines w0.15: -2.8,-3.1 -3.975,-3.1 -3.975,-2.75 -2.8,-2.75 ; -2.8,-2.45 -3.975,-2.45 -3.975,-2.1 -2.8,-2.1 ; -2.8,-1.8 -3.975,-1.8 -3.975,-1.45 -2.8,-1.45 ; -2.8,-1.15 -3.975,-1.15 -3.975,-0.8 -2.8,-0.8 ; -2.8,-0.5 -3.975,-0.5 -3.975,-0.15 -2.8,-0.15 ; -2.8,0.15 -3.975,0.15 -3.975,0.5 -2.8,0.5 ; -2.8,0.8 -3.975,0.8 -3.975,1.15 -2.8,1.15 ; -2.8,1.45 -3.975,1.45 -3.975,1.8 -2.8,1.8 ; -2.8,2.1 -3.975,2.1 -3.975,2.45 -2.8,2.45 ; -2.8,2.75 -3.975,2.75 -3.975,3.1 -2.8,3.1 ; 2.8,-3.1 3.975,-3.1 3.975,-2.75 2.8,-2.75 ; 2.8,-2.45 3.975,-2.45 3.975,-2.1 2.8,-2.1 ; 2.8,-1.8 3.975,-1.8 3.975,-1.45 2.8,-1.45 ; 2.8,-1.15 3.975,-1.15 3.975,-0.8 2.8,-0.8 ; 2.8,-0.5 3.975,-0.5 3.975,-0.15 2.8,-0.15 ; 2.8,0.15 3.975,0.15 3.975,0.5 2.8,0.5 ; 2.8,0.8 3.975,0.8 3.975,1.15 2.8,1.15 ; 2.8,1.45 3.975,1.45 3.975,1.8 2.8,1.8 ; 2.8,2.1 3.975,2.1 3.975,2.45 2.8,2.45 ; 2.8,2.75 3.975,2.75 3.975,3.1 2.8,3.1 ; -2.8,-3.75 2.8,-3.75 2.8,3.75 -2.8,3.75 -2.8,-3.75
CourtTop 15:
  lines w0.05: -0.5,0 0.5,0 ; 0,-0.5 0,0.5 ; -4.75,-4 4.75,-4 4.75,4 -4.75,4 -4.75,-4
3D body "User Library-SSOP 20 PIN-1.step": height 1.98, standoff -0.01, extent -3.95,-3.665 3.95,3.665